# Altium footprint library PcbLib1.PcbLib: 148 footprints (part 5 of 10)
Each footprint in its own frame and in the unit in brackets; x right, y up, seen from the top. Pads: shape width x height; smd on the part's side, far side on the other; paste and mask are expansions set on the pad; w line width, h text height; cw(c..) or ccw(c..) is an arc to the next point about the centre after c.
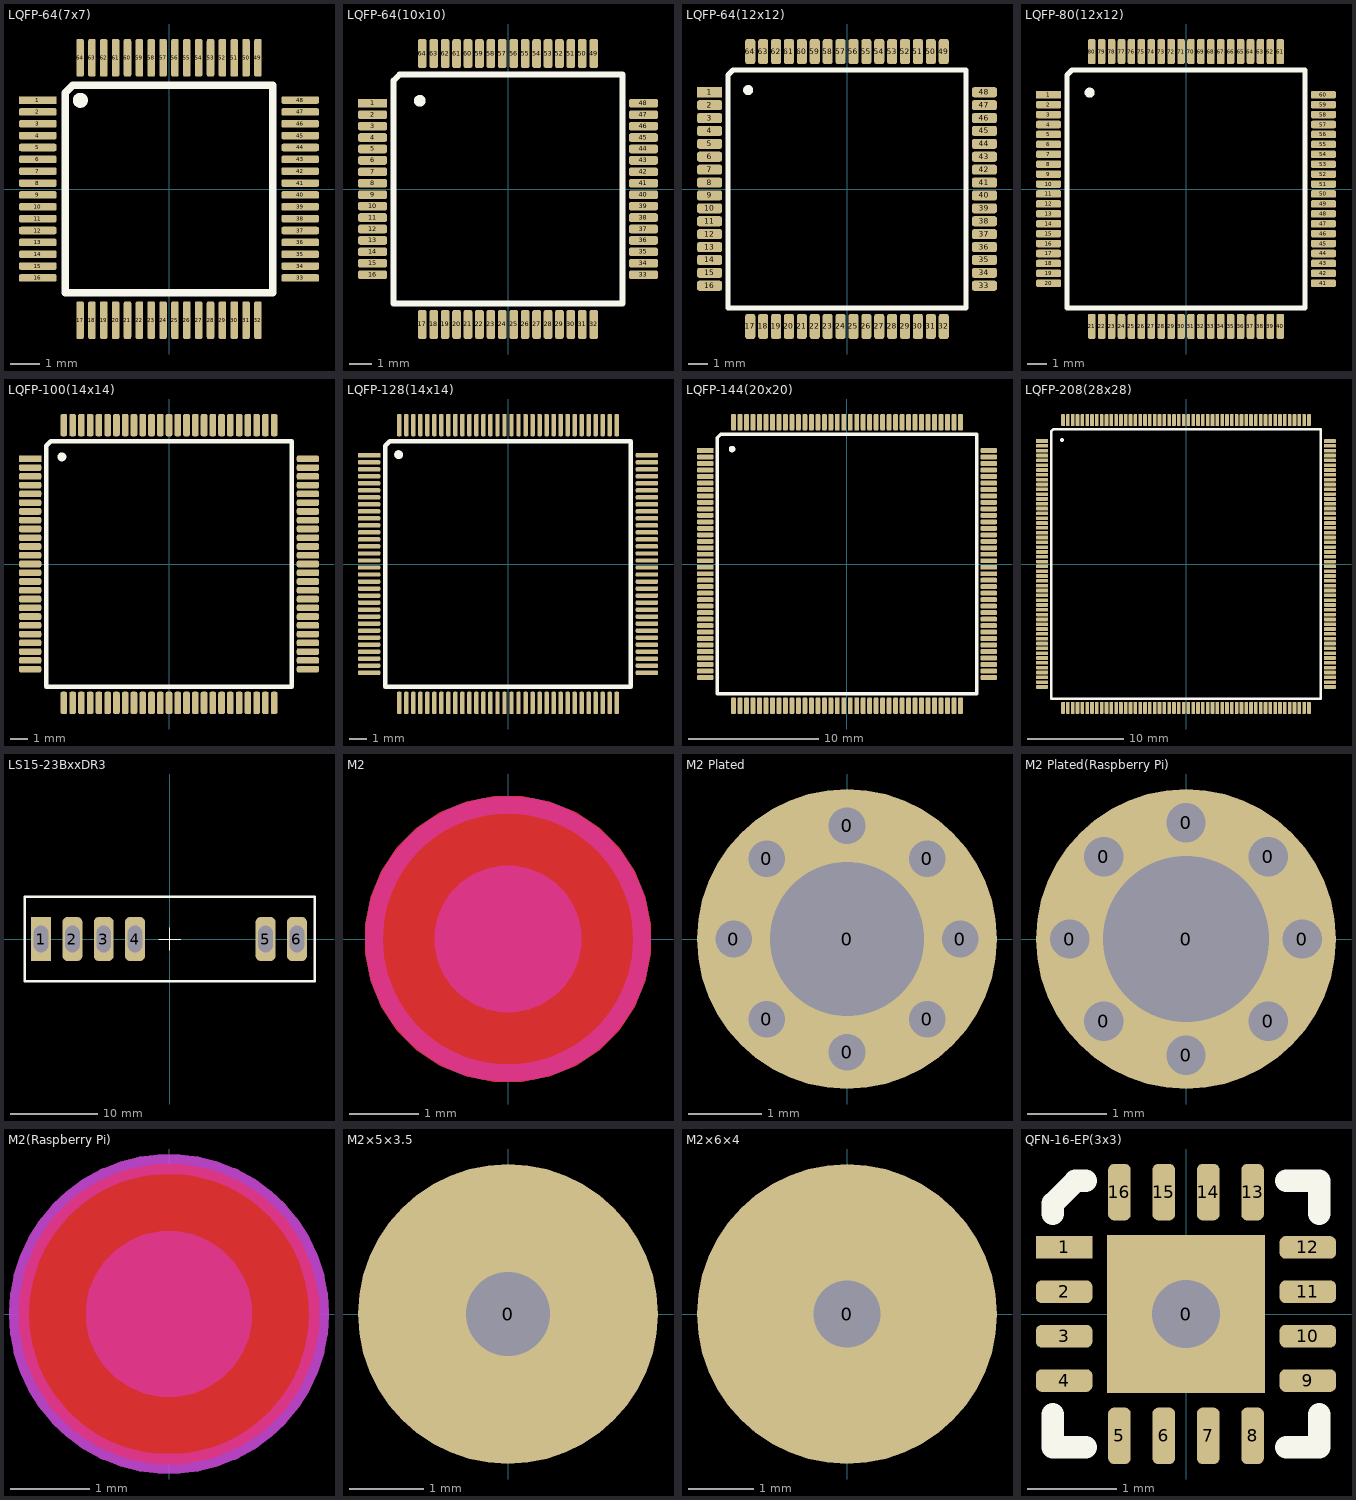
[diagram p4: the footprints below, top view; thin cyan lines are the x and y axes]

## LQFP-64(7x7) [mil]
pads (64):
  rect 50x10 smd: 1(-174.16,118.11)
  rrect50% 50x10 smd: 2(-174.16,102.36) 3(-174.16,86.61) 4(-174.16,70.87) 5(-174.16,55.12) 6(-174.16,39.37) 7(-174.16,23.62) 8(-174.16,7.87) 9(-174.16,-7.87) 10(-174.16,-23.62) 11(-174.16,-39.37) 12(-174.16,-55.12) 13(-174.16,-70.87) 14(-174.16,-86.61) 15(-174.16,-102.36) 16(-174.16,-118.11) 33(174.16,-118.11) 34(174.16,-102.36) 35(174.16,-86.61) 36(174.16,-70.86) 37(174.16,-55.12) 38(174.16,-39.37) 39(174.16,-23.62) 40(174.16,-7.87) 41(174.16,7.88) 42(174.16,23.62) 43(174.16,39.37) 44(174.16,55.12) 45(174.16,70.87) 46(174.16,86.61) 47(174.16,102.36) 48(174.16,118.11)
  rrect50% 10x50 smd: 17(-118.11,-174.16) 18(-102.36,-174.16) 19(-86.61,-174.16) 20(-70.87,-174.16) 21(-55.12,-174.16) 22(-39.37,-174.16) 23(-23.62,-174.16) 24(-7.87,-174.16) 25(7.87,-174.16) 26(23.62,-174.16) 27(39.37,-174.16) 28(55.12,-174.16) 29(70.87,-174.16) 30(86.61,-174.16) 31(102.36,-174.16) 32(118.11,-174.16) 49(118.11,174.16) 50(102.36,174.16) 51(86.61,174.16) 52(70.87,174.16) 53(55.12,174.16) 54(39.37,174.16) 55(23.62,174.16) 56(7.87,174.16) 57(-7.87,174.16) 58(-23.62,174.16) 59(-39.37,174.16) 60(-55.12,174.16) 61(-70.87,174.16) 62(-86.61,174.16) 63(-102.36,174.16) 64(-118.11,174.16)
Top Overlay:
  circle w10: c-117.8,117.8 r5
  lines w10: -137.8,-137.8 137.8,-137.8 137.8,137.8 -127.8,137.8 -137.8,127.8 -137.8,-137.8
3D body "LQFP-64(7x7).step": height 63.11, standoff 0, extent -180.98,-180.98 180.98,180.98

## LQFP-64(10x10) [mil]
pads (64):
  rect 50x15 smd: 1(-233.22,147.64)
  rrect50% 50x15 smd: 2(-233.22,127.95) 3(-233.22,108.27) 4(-233.22,88.58) 5(-233.22,68.9) 6(-233.22,49.21) 7(-233.22,29.53) 8(-233.22,9.84) 9(-233.22,-9.84) 10(-233.22,-29.53) 11(-233.22,-49.21) 12(-233.22,-68.9) 13(-233.22,-88.58) 14(-233.22,-108.27) 15(-233.22,-127.95) 16(-233.22,-147.64) 33(233.22,-147.64) 34(233.22,-127.95) 35(233.22,-108.27) 36(233.22,-88.58) 37(233.22,-68.9) 38(233.22,-49.21) 39(233.22,-29.53) 40(233.22,-9.84) 41(233.22,9.84) 42(233.22,29.53) 43(233.22,49.21) 44(233.22,68.9) 45(233.22,88.58) 46(233.22,108.27) 47(233.22,127.95) 48(233.22,147.64)
  rrect50% 15x50 smd: 17(-147.64,-233.22) 18(-127.95,-233.22) 19(-108.27,-233.22) 20(-88.58,-233.22) 21(-68.9,-233.22) 22(-49.21,-233.22) 23(-29.53,-233.22) 24(-9.84,-233.22) 25(9.84,-233.22) 26(29.53,-233.22) 27(49.21,-233.22) 28(68.9,-233.22) 29(88.58,-233.22) 30(108.27,-233.22) 31(127.95,-233.22) 32(147.64,-233.22) 49(147.64,233.22) 50(127.95,233.22) 51(108.27,233.22) 52(88.58,233.22) 53(68.9,233.22) 54(49.21,233.22) 55(29.53,233.22) 56(9.84,233.22) 57(-9.84,233.22) 58(-29.53,233.22) 59(-49.21,233.22) 60(-68.9,233.22) 61(-88.58,233.22) 62(-108.27,233.22) 63(-127.95,233.22) 64(-147.64,233.22)
Top Overlay:
  circle w10: c-151.85,151.85 r5
  lines w10: -196.85,-196.85 -196.85,186.85 -186.85,196.85 196.85,196.85 196.85,-196.85 -196.85,-196.85
3D body "LQFP-64(10x10).step": height 63.11, standoff 0, extent -236.1,-236.1 236.1,236.1

## LQFP-64(12x12) [mil]
pads (64):
  rect 50x20 smd: 1(-272.59,191.93)
  rrect50% 50x20 smd: 2(-272.59,166.34) 3(-272.59,140.75) 4(-272.59,115.16) 5(-272.59,89.57) 6(-272.59,63.98) 7(-272.59,38.39) 8(-272.59,12.79) 9(-272.59,-12.8) 10(-272.59,-38.39) 11(-272.59,-63.98) 12(-272.59,-89.57) 13(-272.59,-115.16) 14(-272.59,-140.75) 15(-272.59,-166.34) 16(-272.59,-191.93) 33(272.59,-191.93) 34(272.59,-166.34) 35(272.59,-140.75) 36(272.59,-115.16) 37(272.59,-89.57) 38(272.59,-63.98) 39(272.59,-38.39) 40(272.59,-12.8) 41(272.59,12.79) 42(272.59,38.39) 43(272.59,63.98) 44(272.59,89.57) 45(272.59,115.16) 46(272.59,140.75) 47(272.59,166.34) 48(272.59,191.93)
  rrect50% 20x50 smd: 17(-191.93,-272.59) 18(-166.34,-272.59) 19(-140.75,-272.59) 20(-115.16,-272.59) 21(-89.57,-272.59) 22(-63.98,-272.59) 23(-38.39,-272.59) 24(-12.8,-272.59) 25(12.79,-272.59) 26(38.39,-272.59) 27(63.98,-272.59) 28(89.57,-272.59) 29(115.16,-272.59) 30(140.75,-272.59) 31(166.34,-272.59) 32(191.93,-272.59) 49(191.93,272.59) 50(166.34,272.59) 51(140.75,272.59) 52(115.16,272.59) 53(89.57,272.59) 54(63.98,272.59) 55(38.39,272.59) 56(12.79,272.59) 57(-12.8,272.59) 58(-38.39,272.59) 59(-63.98,272.59) 60(-89.57,272.59) 61(-115.16,272.59) 62(-140.75,272.59) 63(-166.34,272.59) 64(-191.93,272.59)
Top Overlay:
  circle w10: c-196.22,196.22 r5
  lines w10: -236.22,-236.22 236.22,-236.22 236.22,236.22 -226.22,236.22 -236.22,226.22 -236.22,-236.22
3D body "LQFP-64(12x12).step": height 63.11, standoff 0, extent -279.49,-279.49 279.49,279.49

## LQFP-80(12x12) [mil]
pads (80):
  rect 50x15 smd: 1(-272.59,187.01)
  rrect50% 50x15 smd: 2(-272.59,167.32) 3(-272.59,147.64) 4(-272.59,127.95) 5(-272.59,108.27) 6(-272.59,88.58) 7(-272.59,68.9) 8(-272.59,49.21) 9(-272.59,29.53) 10(-272.59,9.84) 11(-272.59,-9.84) 12(-272.59,-29.53) 13(-272.59,-49.21) 14(-272.59,-68.9) 15(-272.59,-88.58) 16(-272.59,-108.27) 17(-272.59,-127.95) 18(-272.59,-147.64) 19(-272.59,-167.32) 20(-272.59,-187.01) 41(272.59,-187.01) 42(272.59,-167.32) 43(272.59,-147.64) 44(272.59,-127.95) 45(272.59,-108.27) 46(272.59,-88.58) 47(272.59,-68.9) 48(272.59,-49.21) 49(272.59,-29.53) 50(272.59,-9.84) 51(272.59,9.84) 52(272.59,29.53) 53(272.59,49.21) 54(272.59,68.9) 55(272.59,88.58) 56(272.59,108.27) 57(272.59,127.95) 58(272.59,147.64) 59(272.59,167.32) 60(272.59,187.01)
  rrect50% 15x50 smd: 21(-187.01,-272.59) 22(-167.32,-272.59) 23(-147.64,-272.59) 24(-127.95,-272.59) 25(-108.27,-272.59) 26(-88.58,-272.59) 27(-68.9,-272.59) 28(-49.21,-272.59) 29(-29.53,-272.59) 30(-9.84,-272.59) 31(9.84,-272.59) 32(29.53,-272.59) 33(49.21,-272.59) 34(68.9,-272.59) 35(88.58,-272.59) 36(108.27,-272.59) 37(127.95,-272.59) 38(147.64,-272.59) 39(167.32,-272.59) 40(187.01,-272.59) 61(187.01,272.59) 62(167.32,272.59) 63(147.64,272.59) 64(127.95,272.59) 65(108.27,272.59) 66(88.58,272.59) 67(68.9,272.59) 68(49.21,272.59) 69(29.53,272.59) 70(9.84,272.59) 71(-9.84,272.59) 72(-29.53,272.59) 73(-49.21,272.59) 74(-68.9,272.59) 75(-88.58,272.59) 76(-108.27,272.59) 77(-127.95,272.59) 78(-147.64,272.59) 79(-167.32,272.59) 80(-187.01,272.59)
Top Overlay:
  circle w10: c-191.22,191.22 r5
  lines w10: -236.22,-236.22 -236.22,226.22 -226.22,236.22 236.22,236.22 236.22,-236.22 -236.22,-236.22
3D body "LQFP-80(12x12).step": height 63.11, standoff 0, extent -275.51,-275.51 275.51,275.51

## LQFP-100(14x14) [mil]
pads (100):
  rect 50x15 smd: 1(-311.96,236.22)
  rrect50% 50x15 smd: 2(-311.96,216.53) 3(-311.96,196.85) 4(-311.96,177.16) 5(-311.96,157.48) 6(-311.96,137.79) 7(-311.96,118.11) 8(-311.96,98.42) 9(-311.96,78.74) 10(-311.96,59.05) 11(-311.96,39.37) 12(-311.96,19.68) 13(-311.96,0) 14(-311.96,-19.69) 15(-311.96,-39.37) 16(-311.96,-59.06) 17(-311.96,-78.74) 18(-311.96,-98.43) 19(-311.96,-118.11) 20(-311.96,-137.8) 21(-311.96,-157.48) 22(-311.96,-177.17) 23(-311.96,-196.85) 24(-311.96,-216.54) 25(-311.96,-236.22) 51(311.96,-236.22) 52(311.96,-216.54) 53(311.96,-196.85) 54(311.96,-177.17) 55(311.96,-157.48) 56(311.96,-137.8) 57(311.96,-118.11) 58(311.96,-98.43) 59(311.96,-78.74) 60(311.96,-59.06) 61(311.96,-39.37) 62(311.96,-19.69) 63(311.96,0) 64(311.96,19.68) 65(311.96,39.37) 66(311.96,59.05) 67(311.96,78.74) 68(311.96,98.42) 69(311.96,118.11) 70(311.96,137.79) 71(311.96,157.48) 72(311.96,177.16) 73(311.96,196.85) 74(311.96,216.53) 75(311.96,236.22)
  rrect50% 15x50 smd: 26(-236.22,-311.96) 27(-216.54,-311.96) 28(-196.85,-311.96) 29(-177.17,-311.96) 30(-157.48,-311.96) 31(-137.8,-311.96) 32(-118.11,-311.96) 33(-98.43,-311.96) 34(-78.74,-311.96) 35(-59.06,-311.96) 36(-39.37,-311.96) 37(-19.69,-311.96) 38(0,-311.96) 39(19.68,-311.96) 40(39.37,-311.96) 41(59.05,-311.96) 42(78.74,-311.96) 43(98.42,-311.96) 44(118.11,-311.96) 45(137.79,-311.96) 46(157.48,-311.96) 47(177.16,-311.96) 48(196.85,-311.96) 49(216.53,-311.96) 50(236.22,-311.96) 76(236.22,311.96) 77(216.53,311.96) 78(196.85,311.96) 79(177.16,311.96) 80(157.48,311.96) 81(137.79,311.96) 82(118.11,311.96) 83(98.42,311.96) 84(78.74,311.96) 85(59.05,311.96) 86(39.37,311.96) 87(19.68,311.96) 88(0,311.96) 89(-19.69,311.96) 90(-39.37,311.96) 91(-59.06,311.96) 92(-78.74,311.96) 93(-98.43,311.96) 94(-118.11,311.96) 95(-137.8,311.96) 96(-157.48,311.96) 97(-177.17,311.96) 98(-196.85,311.96) 99(-216.54,311.96) 100(-236.22,311.96)
Top Overlay:
  circle w10: c-240.59,240.59 r5
  lines w10: -275.59,-275.59 -275.59,265.59 -265.59,275.59 275.59,275.59 275.59,-275.59 -275.59,-275.59
3D body "LQFP-100(14x14).step": height 63.11, standoff 0, extent -314.84,-314.84 314.84,314.84

## LQFP-128(14x14) [mil]
pads (128):
  rect 50x10 smd: 1(-311.96,244.09)
  rrect50% 50x10 smd: 2(-311.96,228.35) 3(-311.96,212.6) 4(-311.96,196.85) 5(-311.96,181.1) 6(-311.96,165.35) 7(-311.96,149.61) 8(-311.96,133.86) 9(-311.96,118.11) 10(-311.96,102.36) 11(-311.96,86.61) 12(-311.96,70.87) 13(-311.96,55.12) 14(-311.96,39.37) 15(-311.96,23.62) 16(-311.96,7.87) 17(-311.96,-7.87) 18(-311.96,-23.62) 19(-311.96,-39.37) 20(-311.96,-55.12) 21(-311.96,-70.87) 22(-311.96,-86.61) 23(-311.96,-102.36) 24(-311.96,-118.11) 25(-311.96,-133.86) 26(-311.96,-149.61) 27(-311.96,-165.35) 28(-311.96,-181.1) 29(-311.96,-196.85) 30(-311.96,-212.6) 31(-311.96,-228.35) 32(-311.96,-244.09) 65(311.96,-244.09) 66(311.96,-228.35) 67(311.96,-212.6) 68(311.96,-196.85) 69(311.96,-181.1) 70(311.96,-165.35) 71(311.96,-149.61) 72(311.96,-133.86) 73(311.96,-118.11) 74(311.96,-102.36) 75(311.96,-86.61) 76(311.96,-70.87) 77(311.96,-55.12) 78(311.96,-39.37) 79(311.96,-23.62) 80(311.96,-7.87) 81(311.96,7.87) 82(311.96,23.62) 83(311.96,39.37) 84(311.96,55.12) 85(311.96,70.87) 86(311.96,86.61) 87(311.96,102.36) 88(311.96,118.11) 89(311.96,133.86) 90(311.96,149.61) 91(311.96,165.35) 92(311.96,181.1) 93(311.96,196.85) 94(311.96,212.6) 95(311.96,228.35) 96(311.96,244.09)
  rrect50% 10x50 smd: 33(-244.09,-311.96) 34(-228.35,-311.96) 35(-212.6,-311.96) 36(-196.85,-311.96) 37(-181.1,-311.96) 38(-165.35,-311.96) 39(-149.61,-311.96) 40(-133.86,-311.96) 41(-118.11,-311.96) 42(-102.36,-311.96) 43(-86.61,-311.96) 44(-70.87,-311.96) 45(-55.12,-311.96) 46(-39.37,-311.96) 47(-23.62,-311.96) 48(-7.87,-311.96) 49(7.87,-311.96) 50(23.62,-311.96) 51(39.37,-311.96) 52(55.12,-311.96) 53(70.87,-311.96) 54(86.61,-311.96) 55(102.36,-311.96) 56(118.11,-311.96) 57(133.86,-311.96) 58(149.61,-311.96) 59(165.35,-311.96) 60(181.1,-311.96) 61(196.85,-311.96) 62(212.6,-311.96) 63(228.35,-311.96) 64(244.09,-311.96) 97(244.09,311.96) 98(228.35,311.96) 99(212.6,311.96) 100(196.85,311.96) 101(181.1,311.96) 102(165.35,311.96) 103(149.61,311.96) 104(133.86,311.96) 105(118.11,311.96) 106(102.36,311.96) 107(86.61,311.96) 108(70.87,311.96) 109(55.12,311.96) 110(39.37,311.96) 111(23.62,311.96) 112(7.87,311.96) 113(-7.87,311.96) 114(-23.62,311.96) 115(-39.37,311.96) 116(-55.12,311.96) 117(-70.87,311.96) 118(-86.61,311.96) 119(-102.36,311.96) 120(-118.11,311.96) 121(-133.86,311.96) 122(-149.61,311.96) 123(-165.35,311.96) 124(-181.1,311.96) 125(-196.85,311.96) 126(-212.6,311.96) 127(-228.35,311.96) 128(-244.09,311.96)
Top Overlay:
  circle w10: c-245.59,245.59 r5
  lines w10: -275.59,-275.59 275.59,-275.59 275.59,275.59 -265.59,275.59 -275.59,265.59 -275.59,-275.59
3D body "LQFP-128(14x14).step": height 63.11, standoff 0, extent -315,-315 315,315

## LQFP-144(20x20) [mil]
pads (144):
  rect 50x15 smd: 1(-430.07,344.49)
  rrect50% 50x15 smd: 2(-430.07,324.8) 3(-430.07,305.12) 4(-430.07,285.43) 5(-430.07,265.75) 6(-430.07,246.06) 7(-430.07,226.38) 8(-430.07,206.69) 9(-430.07,187.01) 10(-430.07,167.32) 11(-430.07,147.64) 12(-430.07,127.95) 13(-430.07,108.27) 14(-430.07,88.58) 15(-430.07,68.9) 16(-430.07,49.21) 17(-430.07,29.53) 18(-430.07,9.84) 19(-430.07,-9.84) 20(-430.07,-29.53) 21(-430.07,-49.21) 22(-430.07,-68.9) 23(-430.07,-88.58) 24(-430.07,-108.27) 25(-430.07,-127.95) 26(-430.07,-147.64) 27(-430.07,-167.32) 28(-430.07,-187.01) 29(-430.07,-206.69) 30(-430.07,-226.38) 31(-430.07,-246.06) 32(-430.07,-265.75) 33(-430.07,-285.43) 34(-430.07,-305.12) 35(-430.07,-324.8) 36(-430.07,-344.49) 73(430.07,-344.49) 74(430.07,-324.8) 75(430.07,-305.12) 76(430.07,-285.43) 77(430.07,-265.75) 78(430.07,-246.06) 79(430.07,-226.38) 80(430.07,-206.69) 81(430.07,-187.01) 82(430.07,-167.32) 83(430.07,-147.64) 84(430.07,-127.95) 85(430.07,-108.27) 86(430.07,-88.58) 87(430.07,-68.9) 88(430.07,-49.21) 89(430.07,-29.53) 90(430.07,-9.84) 91(430.07,9.84) 92(430.07,29.53) 93(430.07,49.21) 94(430.07,68.9) 95(430.07,88.58) 96(430.07,108.27) 97(430.07,127.95) 98(430.07,147.64) 99(430.07,167.32) 100(430.07,187.01) 101(430.07,206.69) 102(430.07,226.38) 103(430.07,246.06) 104(430.07,265.75) 105(430.07,285.43) 106(430.07,305.12) 107(430.07,324.8) 108(430.07,344.49)
  rrect50% 15x50 smd: 37(-344.49,-430.07) 38(-324.8,-430.07) 39(-305.12,-430.07) 40(-285.43,-430.07) 41(-265.75,-430.07) 42(-246.06,-430.07) 43(-226.38,-430.07) 44(-206.69,-430.07) 45(-187.01,-430.07) 46(-167.32,-430.07) 47(-147.64,-430.07) 48(-127.95,-430.07) 49(-108.27,-430.07) 50(-88.58,-430.07) 51(-68.9,-430.07) 52(-49.21,-430.07) 53(-29.53,-430.07) 54(-9.84,-430.07) 55(9.84,-430.07) 56(29.53,-430.07) 57(49.21,-430.07) 58(68.9,-430.07) 59(88.58,-430.07) 60(108.27,-430.07) 61(127.95,-430.07) 62(147.64,-430.07) 63(167.32,-430.07) 64(187.01,-430.07) 65(206.69,-430.07) 66(226.38,-430.07) 67(246.06,-430.07) 68(265.75,-430.07) 69(285.43,-430.07) 70(305.12,-430.07) 71(324.8,-430.07) 72(344.49,-430.07) 109(344.49,430.07) 110(324.8,430.07) 111(305.12,430.07) 112(285.43,430.07) 113(265.75,430.07) 114(246.06,430.07) 115(226.38,430.07) 116(206.69,430.07) 117(187.01,430.07) 118(167.32,430.07) 119(147.64,430.07) 120(127.95,430.07) 121(108.27,430.07) 122(88.58,430.07) 123(68.9,430.07) 124(49.21,430.07) 125(29.53,430.07) 126(9.84,430.07) 127(-9.84,430.07) 128(-29.53,430.07) 129(-49.21,430.07) 130(-68.9,430.07) 131(-88.58,430.07) 132(-108.27,430.07) 133(-127.95,430.07) 134(-147.64,430.07) 135(-167.32,430.07) 136(-187.01,430.07) 137(-206.69,430.07) 138(-226.38,430.07) 139(-246.06,430.07) 140(-265.75,430.07) 141(-285.43,430.07) 142(-305.12,430.07) 143(-324.8,430.07) 144(-344.49,430.07)
Top Overlay:
  circle w10: c-348.7,348.7 r5
  lines w10: -393.7,-393.7 393.7,-393.7 393.7,393.7 -383.7,393.7 -393.7,383.7 -393.7,-393.7
3D body "LQFP-144(20x20).step": height 63.11, standoff 0, extent -431.02,-431.02 431.02,431.02

## LQFP-208(28x28) [mil]
pads (208):
  rect 50x15 smd: 1(-587.55,501.97)
  rrect50% 50x15 smd: 2(-587.55,482.28) 3(-587.55,462.6) 4(-587.55,442.91) 5(-587.55,423.23) 6(-587.55,403.54) 7(-587.55,383.86) 8(-587.55,364.17) 9(-587.55,344.49) 10(-587.55,324.8) 11(-587.55,305.12) 12(-587.55,285.43) 13(-587.55,265.75) 14(-587.55,246.06) 15(-587.55,226.38) 16(-587.55,206.69) 17(-587.55,187.01) 18(-587.55,167.32) 19(-587.55,147.64) 20(-587.55,127.95) 21(-587.55,108.27) 22(-587.55,88.58) 23(-587.55,68.9) 24(-587.55,49.21) 25(-587.55,29.53) 26(-587.55,9.84) 27(-587.55,-9.84) 28(-587.55,-29.53) 29(-587.55,-49.21) 30(-587.55,-68.9) 31(-587.55,-88.58) 32(-587.55,-108.27) 33(-587.55,-127.95) 34(-587.55,-147.64) 35(-587.55,-167.32) 36(-587.55,-187.01) 37(-587.55,-206.69) 38(-587.55,-226.38) 39(-587.55,-246.06) 40(-587.55,-265.75) 41(-587.55,-285.43) 42(-587.55,-305.12) 43(-587.55,-324.8) 44(-587.55,-344.49) 45(-587.55,-364.17) 46(-587.55,-383.86) 47(-587.55,-403.54) 48(-587.55,-423.23) 49(-587.55,-442.91) 50(-587.55,-462.6) 51(-587.55,-482.28) 52(-587.55,-501.97) 105(587.55,-501.97) 106(587.55,-482.28) 107(587.55,-462.6) 108(587.55,-442.91) 109(587.55,-423.23) 110(587.55,-403.54) 111(587.55,-383.86) 112(587.55,-364.17) 113(587.55,-344.49) 114(587.55,-324.8) 115(587.55,-305.12) 116(587.55,-285.43) 117(587.55,-265.75) 118(587.55,-246.06) 119(587.55,-226.38) 120(587.55,-206.69) 121(587.55,-187.01) 122(587.55,-167.32) 123(587.55,-147.64) 124(587.55,-127.95) 125(587.55,-108.27) 126(587.55,-88.58) 127(587.55,-68.9) 128(587.55,-49.21) 129(587.55,-29.53) 130(587.55,-9.84) 131(587.55,9.84) 132(587.55,29.53) 133(587.55,49.21) 134(587.55,68.9) 135(587.55,88.58) 136(587.55,108.27) 137(587.55,127.95) 138(587.55,147.64) 139(587.55,167.32) 140(587.55,187.01) 141(587.55,206.69) 142(587.55,226.38) 143(587.55,246.06) 144(587.55,265.75) 145(587.55,285.43) 146(587.55,305.12) 147(587.55,324.8) 148(587.55,344.49) 149(587.55,364.17) 150(587.55,383.86) 151(587.55,403.54) 152(587.55,423.23) 153(587.55,442.91) 154(587.55,462.6) 155(587.55,482.28) 156(587.55,501.97)
  rrect50% 15x50 smd: 53(-501.97,-587.55) 54(-482.28,-587.55) 55(-462.6,-587.55) 56(-442.91,-587.55) 57(-423.23,-587.55) 58(-403.54,-587.55) 59(-383.86,-587.55) 60(-364.17,-587.55) 61(-344.49,-587.55) 62(-324.8,-587.55) 63(-305.12,-587.55) 64(-285.43,-587.55) 65(-265.75,-587.55) 66(-246.06,-587.55) 67(-226.38,-587.55) 68(-206.69,-587.55) 69(-187.01,-587.55) 70(-167.32,-587.55) 71(-147.64,-587.55) 72(-127.95,-587.55) 73(-108.27,-587.55) 74(-88.58,-587.55) 75(-68.9,-587.55) 76(-49.21,-587.55) 77(-29.53,-587.55) 78(-9.84,-587.55) 79(9.84,-587.55) 80(29.53,-587.55) 81(49.21,-587.55) 82(68.9,-587.55) 83(88.58,-587.55) 84(108.27,-587.55) 85(127.95,-587.55) 86(147.64,-587.55) 87(167.32,-587.55) 88(187.01,-587.55) 89(206.69,-587.55) 90(226.38,-587.55) 91(246.06,-587.55) 92(265.75,-587.55) 93(285.43,-587.55) 94(305.12,-587.55) 95(324.8,-587.55) 96(344.49,-587.55) 97(364.17,-587.55) 98(383.86,-587.55) 99(403.54,-587.55) 100(423.23,-587.55) 101(442.91,-587.55) 102(462.6,-587.55) 103(482.28,-587.55) 104(501.97,-587.55) 157(501.97,587.55) 158(482.28,587.55) 159(462.6,587.55) 160(442.91,587.55) 161(423.23,587.55) 162(403.54,587.55) 163(383.86,587.55) 164(364.17,587.55) 165(344.49,587.55) 166(324.8,587.55) 167(305.12,587.55) 168(285.43,587.55) 169(265.75,587.55) 170(246.06,587.55) 171(226.38,587.55) 172(206.69,587.55) 173(187.01,587.55) 174(167.32,587.55) 175(147.64,587.55) 176(127.95,587.55) 177(108.27,587.55) 178(88.58,587.55) 179(68.9,587.55) 180(49.21,587.55) 181(29.53,587.55) 182(9.84,587.55) 183(-9.84,587.55) 184(-29.53,587.55) 185(-49.21,587.55) 186(-68.9,587.55) 187(-88.58,587.55) 188(-108.27,587.55) 189(-127.95,587.55) 190(-147.64,587.55) 191(-167.32,587.55) 192(-187.01,587.55) 193(-206.69,587.55) 194(-226.38,587.55) 195(-246.06,587.55) 196(-265.75,587.55) 197(-285.43,587.55) 198(-305.12,587.55) 199(-324.8,587.55) 200(-344.49,587.55) 201(-364.17,587.55) 202(-383.86,587.55) 203(-403.54,587.55) 204(-423.23,587.55) 205(-442.91,587.55) 206(-462.6,587.55) 207(-482.28,587.55) 208(-501.97,587.55)
Top Overlay:
  circle w10: c-506.18,506.18 r2.72
  lines w10: -551.18,-551.18 -551.18,541.18 -541.18,551.18 551.18,551.18 551.18,-551.18 -551.18,-551.18
3D body "LQFP-208(28x28).step": height 63.11, standoff 0, extent -594.49,-594.49 594.49,594.49

## LS15-23BxxDR3 [mil]
pads (6):
  rect 90x200 hole 65 slot 120 at 90 deg: 1(-582.68,0)
  rrect50% 90x200 hole 65 slot 120 at 90 deg: 2(-440.94,0) 3(-299.21,0) 4(-157.48,0) 5(433.86,0) 6(575.59,0)
Top Overlay:
  lines w5: -50,0 50,0 ; 0,-50 0,50
  lines w10: -656.3,-191.34 656.3,-191.34 656.3,191.34 -656.3,191.34 -656.3,-191.34
3D body "LS15-23BxxDR3.stp": height 847.34, standoff -130.26, extent -656.35,-191.34 656.25,191.34

## M2 [mil] "M2 螺丝孔"
Top Layer:
  pour cut-out: 0,-80.71 -7.95,-80.71 -23.54,-77.61 -38.23,-71.52 -51.45,-62.69 -62.69,-51.45 -71.52,-38.23 -77.61,-23.54 -80.71,-7.95 -80.71,0 -80.71,7.95 -77.61,23.54 -71.52,38.23 -62.69,51.45 -51.45,62.69 -38.23,71.52 -23.54,77.61 -7.95,80.71 0,80.71 7.95,80.71 23.54,77.61 38.23,71.52 51.45,62.69 62.69,51.45 71.52,38.23 77.61,23.54 80.71,7.95 80.71,0 80.71,-7.95 77.61,-23.54 71.52,-38.23 62.69,-51.45 51.45,-62.69 38.23,-71.52 23.54,-77.61 7.95,-80.71
Bottom Layer:
  pour cut-out: 0,-80.71 -7.95,-80.71 -23.54,-77.61 -38.23,-71.52 -51.45,-62.69 -62.69,-51.45 -71.52,-38.23 -77.61,-23.54 -80.71,-7.95 -80.71,0 -80.71,7.95 -77.61,23.54 -71.52,38.23 -62.69,51.45 -51.45,62.69 -38.23,71.52 -23.54,77.61 -7.95,80.71 0,80.71 7.95,80.71 23.54,77.61 38.23,71.52 51.45,62.69 62.69,51.45 71.52,38.23 77.61,23.54 80.71,7.95 80.71,0 80.71,-7.95 77.61,-23.54 71.52,-38.23 62.69,-51.45 51.45,-62.69 38.23,-71.52 23.54,-77.61 7.95,-80.71
Top Solder:
  region: 0,-84.71 -8.34,-84.71 -24.71,-81.45 -40.12,-75.07 -54,-65.8 -65.8,-54 -75.07,-40.12 -81.45,-24.71 -84.71,-8.34 -84.71,0 -84.71,8.34 -81.45,24.71 -75.07,40.12 -65.8,54 -54,65.8 -40.12,75.07 -24.71,81.45 -8.34,84.71 0,84.71 8.34,84.71 24.71,81.45 40.12,75.07 54,65.8 65.8,54 75.07,40.12 81.45,24.71 84.71,8.34 84.71,0 84.71,-8.34 81.45,-24.71 75.07,-40.12 65.8,-54 54,-65.8 40.12,-75.07 24.71,-81.45 8.34,-84.71
Bottom Solder:
  region: 0,-84.71 -8.34,-84.71 -24.71,-81.45 -40.12,-75.07 -54,-65.8 -65.8,-54 -75.07,-40.12 -81.45,-24.71 -84.71,-8.34 -84.71,0 -84.71,8.34 -81.45,24.71 -75.07,40.12 -65.8,54 -54,65.8 -40.12,75.07 -24.71,81.45 -8.34,84.71 0,84.71 8.34,84.71 24.71,81.45 40.12,75.07 54,65.8 65.8,54 75.07,40.12 81.45,24.71 84.71,8.34 84.71,0 84.71,-8.34 81.45,-24.71 75.07,-40.12 65.8,-54 54,-65.8 40.12,-75.07 24.71,-81.45 8.34,-84.71
Keep-Out Layer:
  board cut-out: 0,-41.34 -4.07,-41.34 -12.06,-39.75 -19.58,-36.63 -26.35,-32.11 -32.11,-26.35 -36.63,-19.58 -39.75,-12.06 -41.34,-4.07 -41.34,0 -41.34,4.07 -39.75,12.06 -36.63,19.58 -32.11,26.35 -26.35,32.11 -19.58,36.63 -12.06,39.75 -4.07,41.34 0,41.34 4.07,41.34 12.06,39.75 19.58,36.63 26.35,32.11 32.11,26.35 36.63,19.58 39.75,12.06 41.34,4.07 41.34,0 41.34,-4.07 39.75,-12.06 36.63,-19.58 32.11,-26.35 26.35,-32.11 19.58,-36.63 12.06,-39.75 4.07,-41.34
  board cut-out: 0,-41.34 -4.07,-41.34 -12.06,-39.75 -19.58,-36.63 -26.35,-32.11 -32.11,-26.35 -36.63,-19.58 -39.75,-12.06 -41.34,-4.07 -41.34,0 -41.34,4.07 -39.75,12.06 -36.63,19.58 -32.11,26.35 -26.35,32.11 -19.58,36.63 -12.06,39.75 -4.07,41.34 0,41.34 4.07,41.34 12.06,39.75 19.58,36.63 26.35,32.11 32.11,26.35 36.63,19.58 39.75,12.06 41.34,4.07 41.34,0 41.34,-4.07 39.75,-12.06 36.63,-19.58 32.11,-26.35 26.35,-32.11 19.58,-36.63 12.06,-39.75 4.07,-41.34
Keep-Out Layer:
  circle w10: c0,0 r75.71
Mechanical 1:
  circle w10: c0,0 r41.34

## M2 Plated [mm] "M2 金属化螺丝孔"
pads (9):
  round 0.5 hole 0.5: 0(-1.55,0) 0(-1.096,-1.096) 0(-1.096,1.096) 0(0,-1.55) 0(0,1.55) 0(1.096,-1.096) 0(1.096,1.096) 0(1.55,0)
  round 4.1 hole 2.1: 0(0,0)

## M2 Plated(Raspberry Pi) [mm] "M2 金属化螺丝孔 树莓派尺寸"
pads (9):
  round 0.5 hole 0.5: 0(-1.475,0) 0(-1.043,-1.043) 0(-1.043,1.043) 0(0,-1.475) 0(0,1.475) 0(1.043,-1.043) 0(1.043,1.043) 0(1.475,0)
  round 3.8 hole 2.1: 0(0,0)

## M2(Raspberry Pi) [mil] "M2 螺丝孔 树莓派尺寸"
Top Layer:
  pour cut-out: 0,-74.8 -7.37,-74.8 -21.82,-71.93 -35.43,-66.29 -47.68,-58.1 -58.1,-47.68 -66.29,-35.43 -71.93,-21.82 -74.8,-7.37 -74.8,0 -74.8,7.37 -71.93,21.82 -66.29,35.43 -58.1,47.68 -47.68,58.1 -35.43,66.29 -21.82,71.93 -7.37,74.8 0,74.8 7.37,74.8 21.82,71.93 35.43,66.29 47.68,58.1 58.1,47.68 66.29,35.43 71.93,21.82 74.8,7.37 74.8,0 74.8,-7.37 71.93,-21.82 66.29,-35.43 58.1,-47.68 47.68,-58.1 35.43,-66.29 21.82,-71.93 7.37,-74.8
Bottom Layer:
  pour cut-out: 0,-74.8 -7.37,-74.8 -21.82,-71.93 -35.43,-66.29 -47.68,-58.1 -58.1,-47.68 -66.29,-35.43 -71.93,-21.82 -74.8,-7.37 -74.8,0 -74.8,7.37 -71.93,21.82 -66.29,35.43 -58.1,47.68 -47.68,58.1 -35.43,66.29 -21.82,71.93 -7.37,74.8 0,74.8 7.37,74.8 21.82,71.93 35.43,66.29 47.68,58.1 58.1,47.68 66.29,35.43 71.93,21.82 74.8,7.37 74.8,0 74.8,-7.37 71.93,-21.82 66.29,-35.43 58.1,-47.68 47.68,-58.1 35.43,-66.29 21.82,-71.93 7.37,-74.8
Top Solder:
  region: 0,-74.8 -7.37,-74.8 -21.82,-71.93 -35.43,-66.29 -47.68,-58.1 -58.1,-47.68 -66.29,-35.43 -71.93,-21.82 -74.8,-7.37 -74.8,0 -74.8,7.37 -71.93,21.82 -66.29,35.43 -58.1,47.68 -47.68,58.1 -35.43,66.29 -21.82,71.93 -7.37,74.8 0,74.8 7.37,74.8 21.82,71.93 35.43,66.29 47.68,58.1 58.1,47.68 66.29,35.43 71.93,21.82 74.8,7.37 74.8,0 74.8,-7.37 71.93,-21.82 66.29,-35.43 58.1,-47.68 47.68,-58.1 35.43,-66.29 21.82,-71.93 7.37,-74.8
Bottom Solder:
  region: 0,-74.8 -7.37,-74.8 -21.82,-71.93 -35.43,-66.29 -47.68,-58.1 -58.1,-47.68 -66.29,-35.43 -71.93,-21.82 -74.8,-7.37 -74.8,0 -74.8,7.37 -71.93,21.82 -66.29,35.43 -58.1,47.68 -47.68,58.1 -35.43,66.29 -21.82,71.93 -7.37,74.8 0,74.8 7.37,74.8 21.82,71.93 35.43,66.29 47.68,58.1 58.1,47.68 66.29,35.43 71.93,21.82 74.8,7.37 74.8,0 74.8,-7.37 71.93,-21.82 66.29,-35.43 58.1,-47.68 47.68,-58.1 35.43,-66.29 21.82,-71.93 7.37,-74.8
Keep-Out Layer:
  board cut-out: 0,-41.34 -4.07,-41.34 -12.06,-39.75 -19.58,-36.63 -26.35,-32.11 -32.11,-26.35 -36.63,-19.58 -39.75,-12.06 -41.34,-4.07 -41.34,0 -41.34,4.07 -39.75,12.06 -36.63,19.58 -32.11,26.35 -26.35,32.11 -19.58,36.63 -12.06,39.75 -4.07,41.34 0,41.34 4.07,41.34 12.06,39.75 19.58,36.63 26.35,32.11 32.11,26.35 36.63,19.58 39.75,12.06 41.34,4.07 41.34,0 41.34,-4.07 39.75,-12.06 36.63,-19.58 32.11,-26.35 26.35,-32.11 19.58,-36.63 12.06,-39.75 4.07,-41.34
Keep-Out Layer:
  circle w10: c0,0 r74.8
Mechanical 1:
  circle w10: c0,0 r74.8
  circle w10: c0,0 r41.34

## M2×5×3.5 [mil] "内牙 M2 长度 5 外径 3.5 针长 1.1 针外径 0.9"
pads (1):
  round 160 smd: 0(0,0)
via 0,0 diameter 55 hole 45

## M2×6×4 [mil] "内牙 M2 长度 6 外径 4 针长 1.2 针外径 0.8"
pads (1):
  round 180 smd: 0(0,0)
via 0,0 diameter 50 hole 40

## QFN-16-EP(3x3) [mil]
pads (17):
  rect 70x70 smd mask+4: 0(0,0)
  rect 25x10 smd mask+4: 1(-54.05,29.53)
  rrect50% 25x10 smd mask+4: 2(-54.05,9.84) 3(-54.05,-9.84) 4(-54.05,-29.53) 9(54.05,-29.53) 10(54.05,-9.84) 11(54.05,9.84) 12(54.05,29.53)
  rrect50% 10x25 smd mask+4: 5(-29.53,-54.05) 6(-9.84,-54.05) 7(9.84,-54.05) 8(29.53,-54.05) 13(29.53,54.05) 14(9.84,54.05) 15(-9.84,54.05) 16(-29.53,54.05)
via 0,0 diameter 40 hole 30
Top Overlay:
  lines w10: -59.05,-44.53 -59.06,-59.06 -44.53,-59.06 ; -59.06,44.53 -59.06,49.05 -49.05,59.06 -44.53,59.06 ; 44.53,-59.05 59.06,-59.06 59.06,-44.53 ; 44.53,59.06 59.06,59.06 59.05,44.53
3D body "QFN-16-EP(3x3).step": height 39.37, standoff 0, extent -61.02,-61.02 61.02,61.02